# Altium footprint library ARCOM_Connectors.PcbLib: 84 footprints (part 1 of 6)
Each footprint in its own frame and in the unit in brackets; x right, y up, seen from the top. Pads: shape width x height; smd on the part's side, far side on the other; paste and mask are expansions set on the pad; w line width, h text height; cw(c..) or ccw(c..) is an arc to the next point about the centre after c.
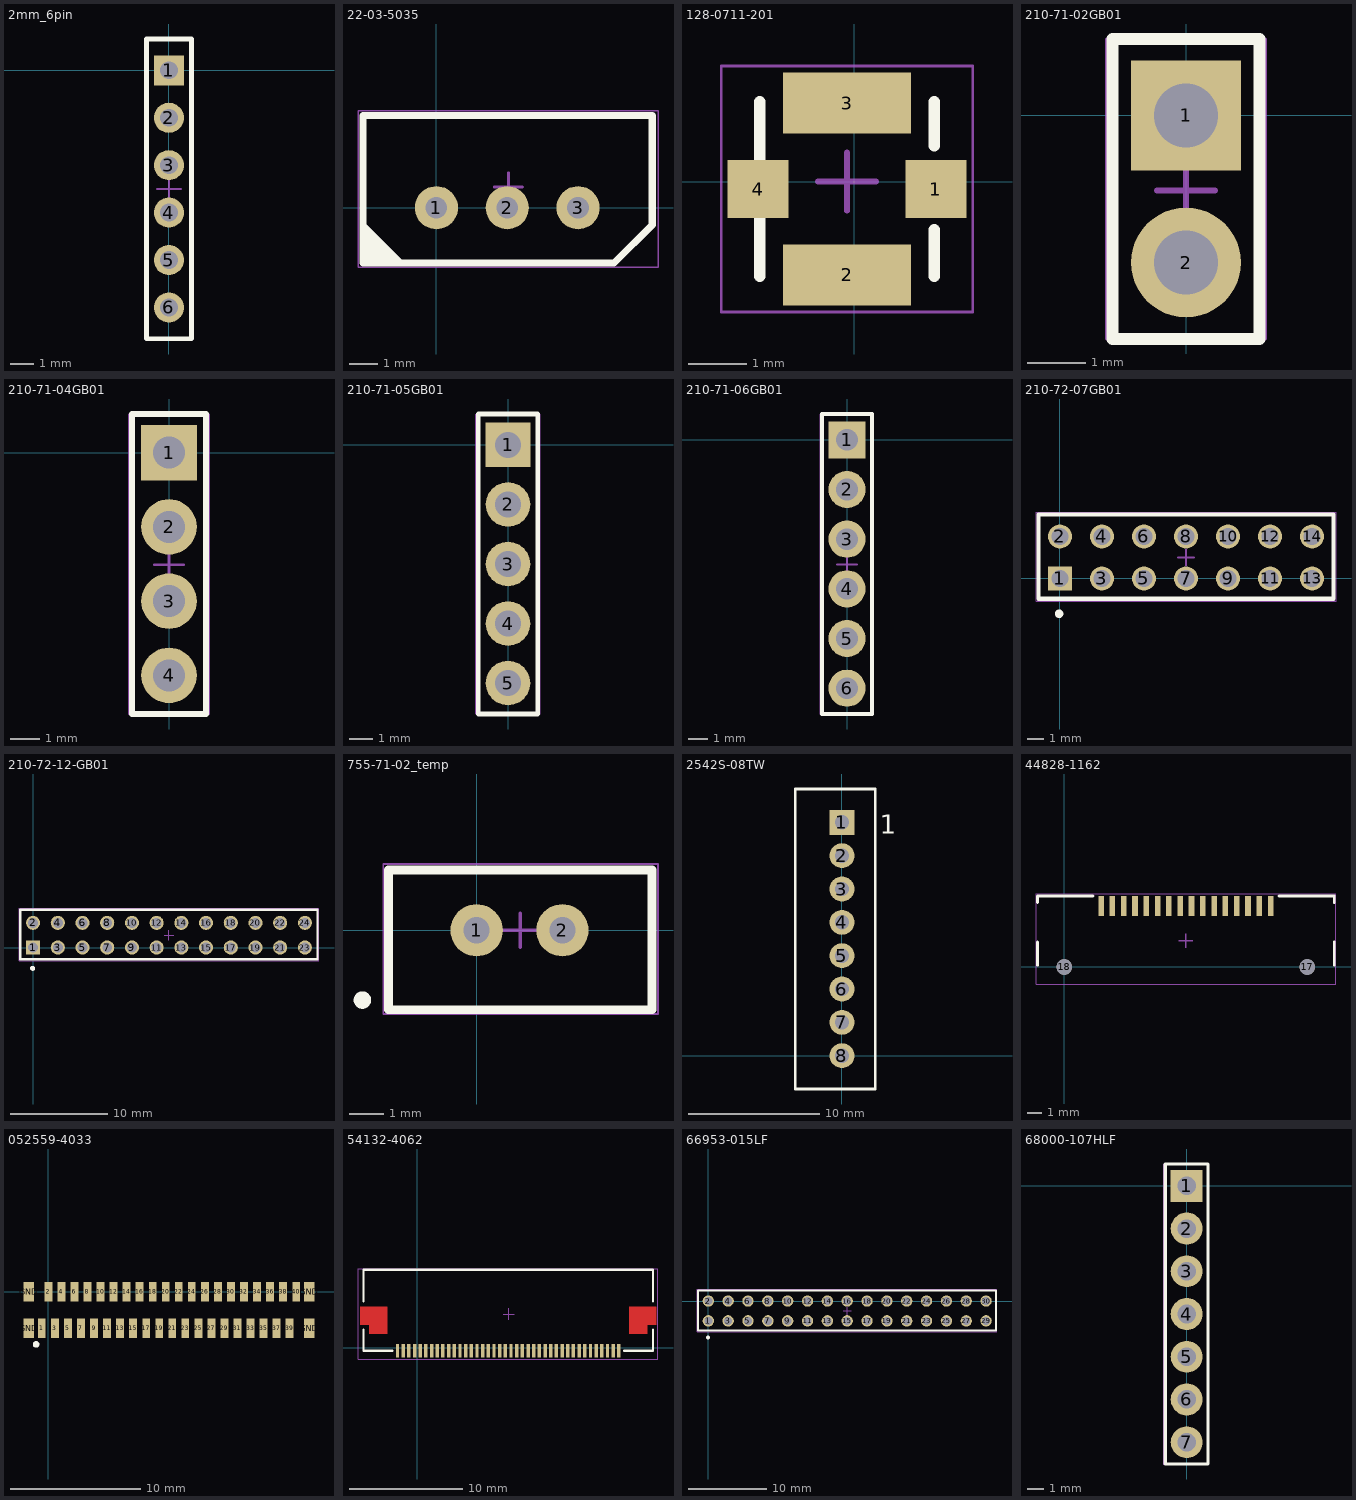
[diagram p0: the footprints below, top view; thin cyan lines are the x and y axes]

## 2mm_6pin [mm]
pads (6):
  rect 1.27x1.27 hole 0.75: 1(0,0)
  round 1.27 hole 0.75: 2(0,-2) 3(0,-4) 4(0,-6) 5(0,-8) 6(0,-10)
Top Overlay:
  lines w0.2: -0.95,-11.321 0.95,-11.321 ; -0.95,1.321 0.95,1.321
  lines w0.203: -0.95,-11.321 -0.95,1.321 ; 0.95,-11.321 0.95,1.321
M15 Top Assy:
  lines w0.05: -0.95,-11.328 0.953,-11.328 0.953,1.321 -0.95,1.321 -0.95,-11.328
  lines w0.1: -0.5,-5.001 0.5,-5.001 ; 0,-5.501 0,-4.501

## 22-03-5035 [mil]
height 232.28
pads (3):
  round 60 hole 30: 1(0,0) 2(98.43,0) 3(196.85,0)
Top Overlay:
  lines w10: -96,-40 -96,-68 -94,-70 -66,-70 -89,-47 -89,-67 -82,-60 -82,-63 ; -102,-25 -102,-77 -50,-77 ; -102,-25 -102,128 300,128 300,-24 247,-77 -50,-77 ; -102,-25 -50,-77
M15 Top Assy:
  lines w1.97: -109,-83 -109,135 308,135 308,-83 -109,-83
  lines w3.94: 80.31,29 119.69,29 ; 100,9.31 100,48.69
3D body "022035035.stp": height 233.14, standoff -136.94, extent -95.88,-71 293.88,121.92

## 128-0711-201 [mm]
pads (4):
  rect 1.05x1 smd: 1(1.398,-0.127)
  rect 2.2x1.05 smd: 2(-0.127,-1.602) 3(-0.127,1.348)
  rect 1.05x1 smd paste-2.54: 4(-1.652,-0.127)
Top Overlay:
  lines w0.2: -1.627,-1.627 -1.627,1.373 ; 1.373,-1.627 1.373,-0.827 ; 1.373,0.618 1.373,1.373
M15 Top Assy:
  lines w0.05: -2.286,-2.235 2.032,-2.235 2.032,1.981 -2.286,1.981 -2.286,-2.235
  lines w0.1: -0.627,0 0.373,0 ; -0.127,-0.5 -0.127,0.5
3D body "User Library-0734120110 - Molex - UMC Antenna Connector SMT.SLDPRT": height 1.3, standoff 0, extent -1.652,-1.678 1.448,1.322

## 210-71-02GB01 [mm]
pads (2):
  rect 1.9x1.9 hole 1.1: 1(0,0)
  round 1.9 hole 1.1: 2(0,-2.54)
Top Overlay:
  lines w0.2: -1.27,-3.861 -1.27,1.321 1.27,1.321 1.27,-3.861 -1.27,-3.861
M15 Top Assy:
  lines w0.05: -1.375,-3.861 1.375,-3.861 1.375,1.321 -1.375,1.321 -1.375,-3.861
  lines w0.1: -0.5,-1.295 0.5,-1.295 ; 0,-1.795 0,-0.795

## 210-71-04GB01 [mm]
pads (4):
  rect 1.9x1.9 hole 1.1: 1(0,0)
  round 1.9 hole 1.1: 2(0,-2.54) 3(0,-5.08) 4(0,-7.62)
Top Overlay:
  lines w0.2: -1.27,-8.941 1.27,-8.941 1.27,1.321 -1.27,1.321 -1.27,-8.941
M15 Top Assy:
  lines w0.05: -1.375,-8.941 1.375,-8.941 1.375,1.321 -1.375,1.321 -1.375,-8.941
  lines w0.1: -0.5,-3.835 0.5,-3.835 ; 0,-4.335 0,-3.335

## 210-71-05GB01 [mm]
pads (5):
  rect 1.9x1.9 hole 1.1: 1(0,0)
  round 1.9 hole 1.1: 2(0,-2.54) 3(0,-5.08) 4(0,-7.62) 5(0,-10.16)
Top Overlay:
  lines w0.2: -1.27,-11.481 -1.27,1.321 1.27,1.321 1.27,-11.481 -1.27,-11.481
M15 Top Assy:
  lines w0.05: -1.375,-11.481 -1.375,1.321 1.375,1.321 1.375,-11.481 -1.375,-11.481
  lines w0.1: -0.5,-5.08 0.5,-5.08 ; 0,-5.58 0,-4.58

## 210-71-06GB01 [mm]
pads (6):
  rect 1.9x1.9 hole 1.1: 1(0,0)
  round 1.9 hole 1.1: 2(0,-2.54) 3(0,-5.08) 4(0,-7.62) 5(0,-10.16) 6(0,-12.7)
Top Overlay:
  lines w0.2: -1.27,-14.021 1.27,-14.021 1.27,1.321 -1.27,1.321 -1.27,-13.97
M15 Top Assy:
  lines w0.05: -1.375,-14.021 1.375,-14.021 1.375,1.321 -1.375,1.321 -1.375,-14.021
  lines w0.1: -0.5,-6.375 0.5,-6.375 ; 0,-6.875 0,-5.875

## 210-72-07GB01 [mm]
height 8.25
pads (14):
  rect 1.45x1.45 hole 1.02: 1(0,0)
  round 1.45 hole 1.02: 2(0,2.54) 3(2.54,0) 4(2.54,2.54) 5(5.08,0) 6(5.08,2.54) 7(7.62,0) 8(7.62,2.54) 9(10.16,0) 10(10.16,2.54) 11(12.7,0) 12(12.7,2.54) 13(15.24,0) 14(15.24,2.54)
Top Overlay:
  circle w0.254: c-0.051,-2.134 r0.127
  lines w0.254: -1.295,-1.219 -1.295,3.861 16.535,3.861 16.535,-1.219 -1.295,-1.219
M15 Top Assy:
  lines w0.05: -1.448,-1.372 -1.448,4.013 16.688,4.013 16.688,-1.372 -1.448,-1.372
  lines w0.1: 7.12,1.27 8.12,1.27 ; 7.62,0.77 7.62,1.77
3D body "90131-0767.stp": height 9.27, standoff -2.88, extent -1.27,-1.219 16.51,3.861

## 210-72-12-GB01 [mm]
height 8.25
pads (24):
  rect 1.45x1.45 hole 1.02: 1(0,0)
  round 1.45 hole 1.02: 2(0,2.54) 3(2.54,0) 4(2.54,2.54) 5(5.08,0) 6(5.08,2.54) 7(7.62,0) 8(7.62,2.54) 9(10.16,0) 10(10.16,2.54) 11(12.7,0) 12(12.7,2.54) 13(15.24,0) 14(15.24,2.54) 15(17.78,0) 16(17.78,2.54) 17(20.32,0) 18(20.32,2.54) 19(22.86,0) 20(22.86,2.54) 21(25.4,0) 22(25.4,2.54) 23(27.94,0) 24(27.94,2.54)
Top Overlay:
  circle w0.254: c-0.051,-2.134 r0.127
  lines w0.254: 29.195,-1.219 -1.295,-1.219 -1.295,3.861 29.235,3.861 29.235,-1.216
M15 Top Assy:
  lines w0.05: -1.448,-1.372 29.389,-1.372 29.389,4.013 -1.448,4.013 -1.448,-1.372
  lines w0.1: 13.47,1.27 14.47,1.27 ; 13.97,0.77 13.97,1.77

## 755-71-02_temp [mil]
pads (2):
  round 60 hole 30: 1(0,0) 2(98.43,0)
Top Overlay:
  circle w10: c-131,-80 r5
  lines w10: -101,-91 201,-91 201,69 -101,69 -101,-91
M15 Top Assy:
  lines w1.97: -107,-96 -107,76 208,76 208,-96 -107,-96
  lines w3.94: 30.31,0 69.69,0 ; 50,-19.68 50,19.69
3D body: height 236.22, standoff 0, extent -99,-87 198,65

## 2542S-08TW [mm]
pads (8):
  rect 1.9x1.9 hole 1.1: 1(0,17.78)
  round 1.9 hole 1.1: 2(0,15.24) 3(0,12.7) 4(0,10.16) 5(0,7.62) 6(0,5.08) 7(0,2.54) 8(0,0)
Top Overlay:
  lines w0.2: -3.556,-2.54 2.54,-2.54 2.54,20.32 -3.556,20.32 -3.556,-2.54
  text "1" at 2.875,16.905 h1.44

## 44828-1162 [mm] "Molex"
pads (18):
  rect 0.4x1.4 smd: 1(14.6,4.32) 2(13.8,4.32) 3(13,4.32) 4(12.2,4.32) 5(11.4,4.32) 6(10.6,4.32) 7(9.8,4.32) 8(9,4.32) 9(8.2,4.32) 10(7.4,4.32) 11(6.6,4.32) 12(5.8,4.32) 13(5,4.32) 14(4.2,4.32) 15(3.4,4.32) 16(2.6,4.32)
  round 1.1 hole 1.1: 17(17.2,0) 18(0,0)
Top Overlay:
  lines w0.2: -1.9,0.12 -1.9,1.776 ; -1.9,4.556 -1.9,5.02 2.026,5.02 ; 15.196,5.02 19.1,5.02 19.1,4.556 ; 19.1,0.12 19.1,1.776
Top Paste:
  region: 18.625,2.12 19.1,2.12 19.1,4.32 17.83,4.32 17.83,3.07 15.93,3.07 15.93,2.12 1.27,2.12 1.27,3.07 -0.63,3.07 -0.63,4.32 -1.9,4.32 -1.9,2.12 -1.425,2.12 -1.425,-1.13 1.64,-1.13 1.64,0.375 15.56,0.375 15.56,-1.13 18.625,-1.13
Top Solder:
  region: 18.625,2.12 19.1,2.12 19.1,4.32 17.83,4.32 17.83,3.07 15.93,3.07 15.93,2.12 1.27,2.12 1.27,3.07 -0.63,3.07 -0.63,4.32 -1.9,4.32 -1.9,2.12 -1.425,2.12 -1.425,-1.13 1.64,-1.13 1.64,0.375 15.56,0.375 15.56,-1.13 18.625,-1.13
M15 Top Assy:
  lines w0.05: -2.007,-1.219 -2.007,5.182 19.228,5.182 19.228,-1.219 -2.007,-1.219
  lines w0.1: 8.085,1.854 9.085,1.854 ; 8.585,1.354 8.585,2.354
3D body "448281162.stp": height 3.49, standoff -0.61, extent -1.915,-1.175 19.085,4.775

## 052559-4033 [mm]
height 5.8
pads (44):
  rect 0.6x1.5 smd: 1(-0.5,-2.8) 2(0,0) 3(0.5,-2.8) 4(1,0) 5(1.5,-2.8) 6(2,0) 7(2.5,-2.8) 8(3,0) 9(3.5,-2.8) 10(4,0) 11(4.5,-2.8) 12(5,0) 13(5.5,-2.8) 14(6,0) 15(6.5,-2.8) 16(7,0) 17(7.5,-2.8) 18(8,0) 19(8.5,-2.8) 20(9,0) 21(9.5,-2.8) 22(10,0) 23(10.5,-2.8) 24(11,0) 25(11.5,-2.8) 26(12,0) 27(12.5,-2.8) 28(13,0) 29(13.5,-2.8) 30(14,0) 31(14.5,-2.8) 32(15,0) 33(15.5,-2.8) 34(16,0) 35(16.5,-2.8) 36(17,0) 37(17.5,-2.8) 38(18,0) 39(18.5,-2.8) 40(19,0)
  rect 0.8x1.5 smd: GND(-1.5,-2.8) GND(-1.5,0) GND(20,-2.8) GND(20,0)
Top Overlay:
  circle w0.254: c-0.94,-4.039 r0.127
3D body "525594033.stp": height 5.3, standoff 0, extent -3.579,-3.046 22.121,0.454

## 54132-4062 [mm]
pads (40):
  rect 0.3x1.2 smd mask+0.051: 1(17.776,-0.258) 2(17.276,-0.258) 3(16.776,-0.258) 4(16.276,-0.258) 5(15.776,-0.258) 6(15.276,-0.258) 7(14.776,-0.258) 8(14.276,-0.258) 9(13.776,-0.258) 10(13.276,-0.258) 11(12.776,-0.258) 12(12.276,-0.258) 13(11.776,-0.258) 14(11.276,-0.258) 15(10.776,-0.258) 16(10.276,-0.258) 17(9.776,-0.258) 18(9.276,-0.258) 19(8.776,-0.258) 20(8.276,-0.258) 21(7.776,-0.258) 22(7.276,-0.258) 23(6.776,-0.258) 24(6.276,-0.258) 25(5.776,-0.258) 26(5.276,-0.258) 27(4.776,-0.258) 28(4.276,-0.258) 29(3.776,-0.258) 30(3.276,-0.258) 31(2.776,-0.258) 32(2.276,-0.258) 33(1.776,-0.258) 34(1.276,-0.258) 35(0.776,-0.258) 36(0.276,-0.258) 37(-0.224,-0.258) 38(-0.724,-0.258) 39(-1.224,-0.258) 40(-1.724,-0.258)
Top Layer:
  region: 21.076,2.042 21.076,3.642 18.676,3.642 18.676,1.242 20.276,1.242 20.276,2.042
  region: -4.224,2.042 -4.224,1.242 -2.624,1.242 -2.624,3.642 -5.024,3.642 -5.024,2.042
Top Overlay:
  lines w0.2: -4.724,1.592 -4.724,-0.258 -2.174,-0.258 ; -4.724,4.092 -4.724,6.892 20.776,6.892 20.776,4.092 ; 18.226,-0.258 20.776,-0.258 20.776,1.592
Top Paste:
  region: 21.076,2.042 21.076,3.642 18.676,3.642 18.676,1.242 20.276,1.242 20.276,2.042
  region: -4.224,2.042 -4.224,1.242 -2.624,1.242 -2.624,3.642 -5.024,3.642 -5.024,2.042
Top Solder:
  region: -4.374,1.092 -2.474,1.092 -2.474,3.792 -5.174,3.792 -5.174,1.892 -4.374,1.892
  region: 20.426,1.892 21.226,1.892 21.226,3.792 18.526,3.792 18.526,1.092 20.426,1.092
M15 Top Assy:
  lines w0.05: -5.207,-1.016 21.209,-1.016 21.209,6.985 -5.207,6.985 -5.207,-1.016
  lines w0.1: 7.577,2.972 8.577,2.972 ; 8.077,2.472 8.077,3.472
3D body "541324062.stp": height 1.95, standoff -0.05, extent -4.698,-0.164 20.802,5.436

## 66953-015LF [mm]
height 8.25
pads (30):
  round 1.45 hole 1.02: 1(0,-2.54) 2(0,0) 3(2.54,-2.54) 4(2.54,0) 5(5.08,-2.54) 6(5.08,0) 7(7.62,-2.54) 8(7.62,0) 9(10.16,-2.54) 10(10.16,0) 11(12.7,-2.54) 12(12.7,0) 13(15.24,-2.54) 14(15.24,0) 15(17.78,-2.54) 16(17.78,0) 17(20.32,-2.54) 18(20.32,0) 19(22.86,-2.54) 20(22.86,0) 21(25.4,-2.54) 22(25.4,0) 23(27.94,-2.54) 24(27.94,0) 25(30.48,-2.54) 26(30.48,0) 27(33.02,-2.54) 28(33.02,0) 29(35.56,-2.54) 30(35.56,0)
Top Overlay:
  circle w0.254: c-0.051,-4.674 r0.127
  lines w0.254: -1.295,-3.759 -1.295,1.321 36.805,1.321 36.805,-3.759 -1.295,-3.759
M15 Top Assy:
  lines w0.05: -1.448,-3.912 -1.448,1.473 36.957,1.473 36.957,-3.912 -1.448,-3.912
  lines w0.1: 17.28,-1.27 18.28,-1.27 ; 17.78,-1.77 17.78,-0.77
3D body "30_pin_female_header.stp": height 8.5, standoff -3.5, extent -1.545,-3.976 37.055,1.524

## 68000-107HLF [mm]
pads (7):
  rect 1.9x1.9 hole 1.1: 1(0,0)
  round 1.9 hole 1.1: 2(0,-2.54) 3(0,-5.08) 4(0,-7.62) 5(0,-10.16) 6(0,-12.7) 7(0,-15.24)
Top Overlay:
  lines w0.2: -1.27,-16.535 1.27,-16.535 1.27,1.295 -1.27,1.295 -1.27,-16.535
M15 Top Assy:
  lines w0.05: -1.35,-16.535 -1.35,1.295 1.27,1.295 1.27,-16.535 -1.35,-16.535
  lines w0.1: -0.475,-7.62 0.525,-7.62 ; 0.025,-8.12 0.025,-7.12